# Altium footprint library Project_Oshinoko.PcbLib: 211 footprints (part 10 of 14)
Each footprint in its own frame and in the unit in brackets; x right, y up, seen from the top. Pads: shape width x height; smd on the part's side, far side on the other; paste and mask are expansions set on the pad; w line width, h text height; cw(c..) or ccw(c..) is an arc to the next point about the centre after c.
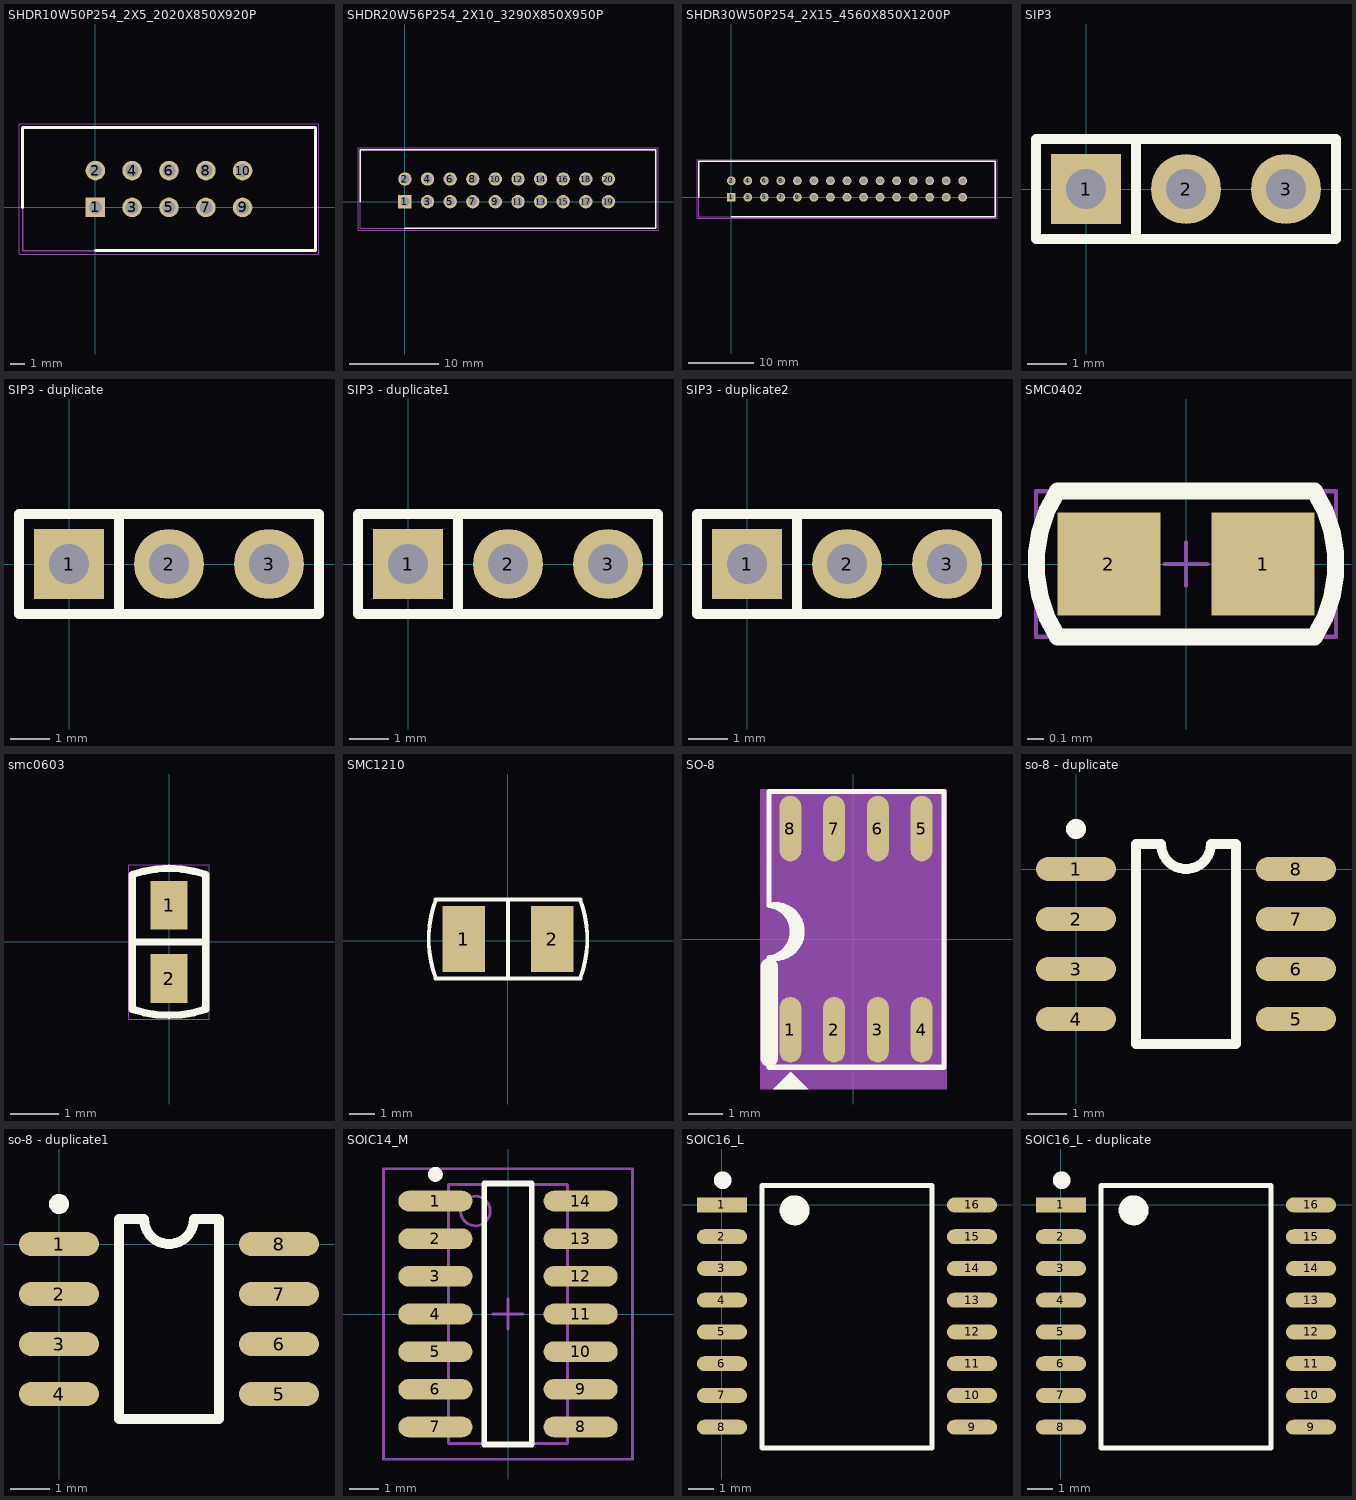
[diagram p9: the footprints below, top view; thin cyan lines are the x and y axes]

## SHDR10W50P254_2X5_2020X850X920P [mm]
pads (10):
  rect 1.35x1.35 hole 0.9: 1(0,0)
  round 1.35 hole 0.9: 2(0,2.54) 3(2.54,0) 4(2.54,2.54) 5(5.08,0) 6(5.08,2.54) 7(7.62,0) 8(7.62,2.54) 9(10.16,0) 10(10.16,2.54)
Top Overlay:
  lines w0.2: -5.02,0 -5.02,5.52 15.18,5.52 15.18,-2.98 0,-2.98
Mechanical 13:
  lines w0.1: -5.02,-2.98 -5.02,5.52 15.18,5.52 15.18,-2.98 -5.02,-2.98
Mechanical 15:
  lines w0.05: -5.27,-3.23 -5.27,5.77 15.43,5.77 15.43,-3.23 -5.27,-3.23
3D body "HIF3FC-10PA-2.54DSA_71_.stp": height 9.2, standoff -2.8, extent -5.02,-2.98 15.18,5.52

## SHDR20W56P254_2X10_3290X850X950P [mm]
pads (20):
  rect 1.5x1.5 hole 1: 1(0,0)
  round 1.5 hole 1: 2(0,2.54) 3(2.54,0) 4(2.54,2.54) 5(5.08,0) 6(5.08,2.54) 7(7.62,0) 8(7.62,2.54) 9(10.16,0) 10(10.16,2.54) 11(12.7,0) 12(12.7,2.54) 13(15.24,0) 14(15.24,2.54) 15(17.78,0) 16(17.78,2.54) 17(20.32,0) 18(20.32,2.54) 19(22.86,0) 20(22.86,2.54)
Top Overlay:
  lines w0.2: -5.02,0 -5.02,5.82 28.18,5.82 28.18,-2.98 0,-2.98
Mechanical 13:
  lines w0.1: -5.02,-2.98 28.18,-2.98 28.18,5.82 -5.02,5.82 -5.02,-2.98
Mechanical 15:
  lines w0.05: -5.27,-3.23 28.43,-3.23 28.43,6.07 -5.27,6.07 -5.27,-3.23
3D body "HIF3FC-20PA-2.54DSA_71_.stp": height 9.5, standoff -3.1, extent -5.02,-2.98 27.88,5.52

## SHDR30W50P254_2X15_4560X850X1200P [mm]
pads (30):
  rect 1.35x1.35 hole 0.9: 1(0,0)
  round 1.35 hole 0.9: 2(0,2.54) 3(2.54,0) 4(2.54,2.54) 5(5.08,0) 6(5.08,2.54) 7(7.62,0) 8(7.62,2.54) 9(10.16,0) 10(10.16,2.54) 11(12.7,0) 12(12.7,2.54) 13(15.24,0) 14(15.24,2.54) 15(17.78,0) 16(17.78,2.54) 17(20.32,0) 18(20.32,2.54) 19(22.86,0) 20(22.86,2.54) 21(25.4,0) 22(25.4,2.54) 23(27.94,0) 24(27.94,2.54) 25(30.48,0) 26(30.48,2.54) 27(33.02,0) 28(33.02,2.54) 29(35.56,0) 30(35.56,2.54)
Top Overlay:
  lines w0.2: -5.02,0 -5.02,5.52 40.58,5.52 40.58,-2.98 0,-2.98
Mechanical 13:
  lines w0.1: -5.02,-2.98 -5.02,5.52 40.58,5.52 40.58,-2.98 -5.02,-2.98
Mechanical 15:
  lines w0.05: -5.27,-3.23 -5.27,5.77 40.83,5.77 40.83,-3.23 -5.27,-3.23
3D body "HIF3FC-30PA-2.54DSA_71_.stp": height 12, standoff -2.8, extent -5.02,-2.98 40.58,5.52

## SIP3 [mil]
pads (3):
  rect 70x70 hole 40: 1(0,0)
  round 70 hole 40: 2(100,0) 3(200,0)
Top Overlay:
  lines w10: 50,-50 50,50 ; -50,-50 250,-50 250,50 -50,50 -50,-50

## SIP3 - duplicate [mil]
pads (3):
  rect 70x70 hole 40: 1(0,0)
  round 70 hole 40: 2(100,0) 3(200,0)
Top Overlay:
  lines w10: 50,-50 50,50 ; -50,-50 -50,50 250,50 250,-50 -50,-50

## SIP3 - duplicate1 [mil]
pads (3):
  rect 70x70 hole 40: 1(0,0)
  round 70 hole 40: 2(100,0) 3(200,0)
Top Overlay:
  lines w10: 50,-50 50,50 ; -50,-50 250,-50 250,50 -50,50 -50,-50

## SIP3 - duplicate2 [mil]
pads (3):
  rect 70x70 hole 40: 1(0,0)
  round 70 hole 40: 2(100,0) 3(200,0)
Top Overlay:
  lines w10: 50,-50 50,50 ; -50,-50 250,-50 250,50 -50,50 -50,-50

## SMC0402 [mil] "SMC0402"
pads (2):
  rect 24x24 smd: 1(18,0) 2(-18,0)
Top Overlay:
  lines w4: -30,-17 cw(c-3.6,0) -30,17 ; -29.83,17 29.94,17 ; -29.42,-17 29.44,-17 ; 30,-17 ccw(c3.6,0) 30,17
Mechanical 14:
  lines w1: -35,-17 -35,17 35,17 35,-17 -35,-17
Mechanical 15:
  lines w1: -5,0 5,0 ; 0,-5 0,5
Mechanical 16:
  lines w1: -35,-17 -35,17 35,17 35,-17 -35,-17

## smc0603 [mil] "SMC0603"
pads (2):
  rect 30x40 smd: 1(0,29.93) 2(0,-30.07)
Top Overlay:
  lines w6: -30,-0.07 30,-0.07 ; -30,-55.07 ccw(c0,32.43) 30,-55.07 30,54.93 ccw(c0,-30.07) -30,54.93 -30,-55.07
Mechanical 10:
  text "1" at -10,29.93 h25
  text "2" at -10,-30.07 h25
Mechanical 11:
  lines w1: -33,-63.07 33,-63.07 33,63.07 -33,63.07 -33,-63.07

## SMC1210 [mil]
pads (2):
  rect 65x100 smd: 1(-67,3) 2(68,3)
Top Overlay:
  lines w6: 0.5,-57 0.5,63 ; -109.5,-57 cw(c54.25,3) -109.5,63 110.5,63 cw(c-53.25,3) 110.5,-57 -109.5,-57
3D body "1210_C.step": height 37.01, standoff 0, extent -60,-47 65.98,51.43

## SO-8 [mm] "SO-8"
pads (8):
  oval 0.635x1.905 smd: 1(-1.832,-2.635) 2(-0.562,-2.635) 3(0.708,-2.635) 4(1.978,-2.635) 5(1.978,3.207) 6(0.708,3.207) 7(-0.562,3.207) 8(-1.832,3.207)
Top Overlay:
  pour cut-out: -2.324,-4.356 -1.308,-4.356 -1.816,-3.848
  lines w0.152: -2.451,-0.546 ccw(c-2.273,0.216) -2.451,0.978 ; -2.451,-0.546 ccw(c-2.54,0.216) -2.451,0.978 ; -2.451,-0.546 ccw(c-2.388,0.216) -2.451,0.978 ; -2.451,-0.546 -2.451,-3.721 2.629,-3.721 2.629,4.28 -0.292,4.28 -2.451,4.28 -2.451,0.978
  lines w0.508: -2.451,-3.467 -2.451,-0.8
Mechanical 8:
  text "2" at -0.562,-2.381 h0.64
  text "4" at 1.978,-2.381 h0.64
  text "6" at 0.708,3.461 h0.64
  text "1" at -1.832,-2.381 h0.64
  text "8" at -1.832,3.461 h0.64
  text "7" at -0.562,3.461 h0.64
  text "3" at 0.708,-2.381 h0.64
  text "5" at 1.978,3.461 h0.64
Mechanical 10:
  region: -2.705,-4.356 2.705,-4.356 2.705,4.356 -2.705,4.356

## so-8 - duplicate [mil]
pads (8):
  oval 80x24 smd: 1(0,0) 2(0,-50) 3(0,-100) 4(0,-150) 5(220,-150) 6(220,-100) 7(220,-50) 8(220,0)
Top Overlay:
  circle w10: c0,40 r5
  lines w10: 60,-175 60,25 85,25 ccw(c110,25) 135,25 160,25 160,-175 60,-175

## so-8 - duplicate1 [mil]
pads (8):
  oval 80x24 smd: 1(0,0) 2(0,-50) 3(0,-100) 4(0,-150) 5(220,-150) 6(220,-100) 7(220,-50) 8(220,0)
Top Overlay:
  circle w10: c0,40 r5
  lines w10: 60,-175 60,25 85,25 ccw(c110,25) 135,25 160,25 160,-175 60,-175

## SOIC14_M [mm]
pads (14):
  oval 2.5x0.7 smd: 1(-2.45,3.81) 2(-2.45,2.54) 3(-2.45,1.27) 4(-2.45,0) 5(-2.45,-1.27) 6(-2.45,-2.54) 7(-2.45,-3.81) 8(2.45,-3.81) 9(2.45,-2.54) 10(2.45,-1.27) 11(2.45,0) 12(2.45,1.27) 13(2.45,2.54) 14(2.45,3.81)
Top Overlay:
  circle w0.25: c-2.45,4.71 r0.125
  lines w0.2: -0.8,-4.4 0.8,-4.4 0.8,4.4 -0.8,4.4 -0.8,-4.4
Mechanical 13:
  circle w0.1: c-1.1,3.475 r0.5
  lines w0.1: -2,-4.375 2,-4.375 2,4.375 -2,4.375 -2,-4.375
Mechanical 15:
  lines w0.1: -0.5,0 0.5,0 ; 0,-0.5 0,0.5 ; -4.2,-4.9 4.2,-4.9 4.2,4.9 -4.2,4.9 -4.2,-4.9
3D body: height 1.75, standoff 0, extent -2,-4.375 2,4.375

## SOIC16_L [mm]
pads (16):
  rect 2x0.6 smd: 1(0,0)
  oval 2x0.6 smd: 2(0,-1.27) 3(0,-2.54) 4(0,-3.81) 5(0,-5.08) 6(0,-6.35) 7(0,-7.62) 8(0,-8.89) 9(10,-8.89) 10(10,-7.62) 11(10,-6.35) 12(10,-5.08) 13(10,-3.81) 14(10,-2.54) 15(10,-1.27) 16(10,0)
Top Overlay:
  circle w0.6: c2.905,-0.213 r0.3
  circle w0.356: c0.025,0.991 r0.178
  lines w0.2: 1.6,-9.713 8.4,-9.713 8.4,0.787 1.6,0.787 1.6,-9.713

## SOIC16_L - duplicate [mm]
pads (16):
  rect 2x0.6 smd: 1(0,0)
  oval 2x0.6 smd: 2(0,-1.27) 3(0,-2.54) 4(0,-3.81) 5(0,-5.08) 6(0,-6.35) 7(0,-7.62) 8(0,-8.89) 9(10,-8.89) 10(10,-7.62) 11(10,-6.35) 12(10,-5.08) 13(10,-3.81) 14(10,-2.54) 15(10,-1.27) 16(10,0)
Top Overlay:
  circle w0.356: c0.025,0.991 r0.178
  circle w0.6: c2.905,-0.213 r0.3
  lines w0.2: 1.6,-9.713 1.6,0.787 8.4,0.787 8.4,-9.713 1.6,-9.713